# Altium footprint library heromap.PcbLib: 593 footprints (part 33 of 38)
Each footprint in its own frame and in the unit in brackets; x right, y up, seen from the top. Pads: shape width x height; smd on the part's side, far side on the other; paste and mask are expansions set on the pad; w line width, h text height; cw(c..) or ccw(c..) is an arc to the next point about the centre after c.
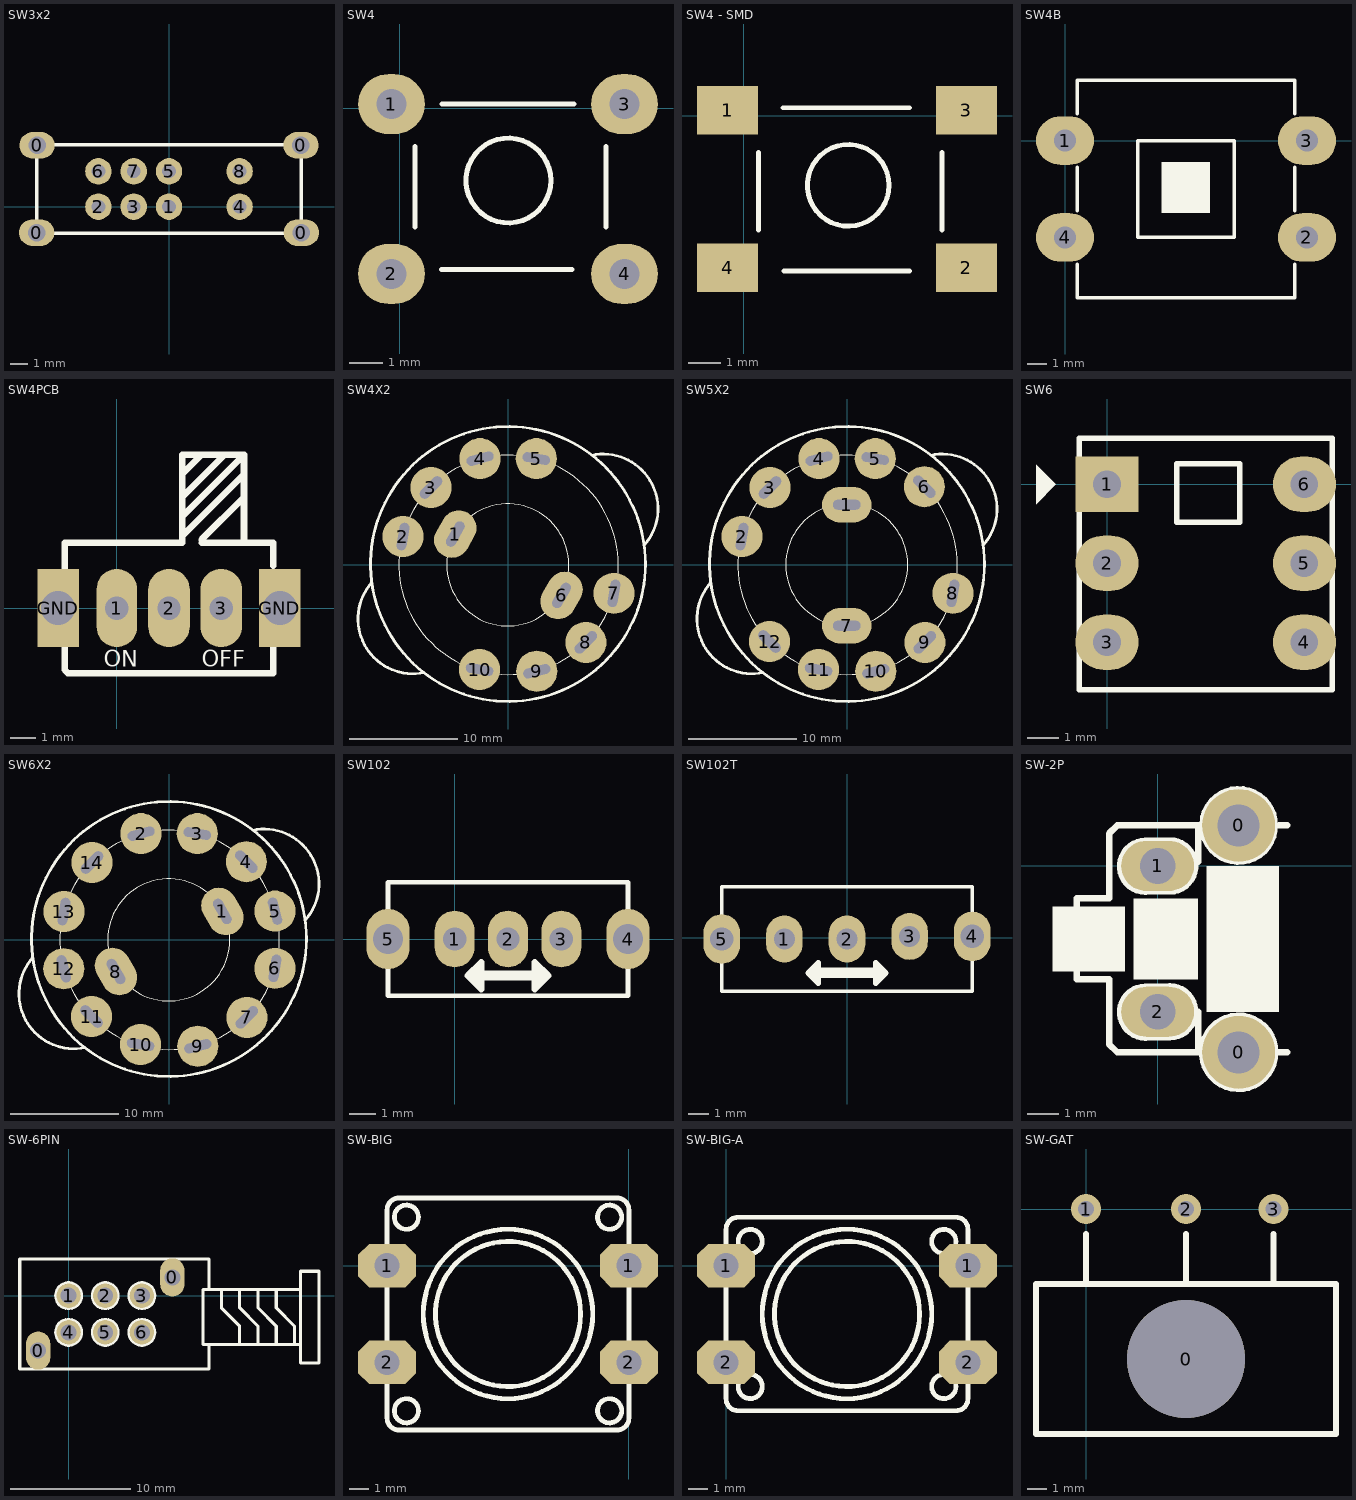
[diagram p32: the footprints below, top view; thin cyan lines are the x and y axes]

## SW3x2 [mil] "Switch 3x2 - pin to pin 80"
height 500
pads (12):
  oval 80x60 hole 40: 0(-300,-59) 0(-299,139) 0(299,139) 0(300,-59)
  round 60 hole 31: 1(0,0) 2(-160,0) 3(-80,0) 4(160,0) 5(0,80) 6(-160,80) 7(-80,80) 8(160,80)
Top Overlay:
  lines w8: -300,-60 300,-60 300,140 -300,140 -300,-60

## SW4 [mm] "SW button 4pin, 250 x250 mil"
height 2.54
pads (4):
  oval 2x1.8 hole 0.9: 1(-0.254,0.127) 2(-0.254,-4.953) 3(6.731,0.127) 4(6.731,-4.953)
Top Overlay:
  circle w0.152: c3.251,-2.159 r1.27
  lines w0.152: 0.457,-3.556 0.457,-1.143 ; 1.245,-4.826 5.156,-4.826 ; 1.27,0.127 5.207,0.127 ; 6.172,-3.556 6.172,-1.143
  lines w0.178: 6.147,-5.207 6.172,-5.182
3D body "SW3dPS-.STEP": height 7, standoff -3.5, extent -0.826,-5.334 7.074,0.866

## SW4 - SMD [mm] "SW button 4pin, 250 x250 mil"
height 2.54
pads (4):
  rect 1.905x1.5 smd: 1(-0.5,0.178) 2(6.926,-4.724) 3(6.926,0.178) 4(-0.5,-4.724)
Top Overlay:
  circle w0.152: c3.251,-2.159 r1.27
  lines w0.152: 0.457,-3.556 0.457,-1.143 ; 1.219,0.254 5.156,0.254 ; 1.245,-4.826 5.156,-4.826 ; 6.172,-3.556 6.172,-1.143
  lines w0.178: 6.147,-5.207 6.172,-5.182
3D body "SW3dPS-.STEP": height 7, standoff -3.5, extent -0.826,-5.334 7.074,0.866

## SW4B [mil] "SW button 4pin, 450 x 450 mil"
height 100
pads (4):
  oval 120x100 hole 45: 1(0,0) 2(500,-200) 3(500,0) 4(0,-200)
Top Overlay:
  rectangle: 199,-150 300,-44
  lines w7: 25,-255 25,-325 475,-325 475,-255 ; 25,-145 25,-55 ; 25,55 25,125 475,125 475,55 ; 475,-145 475,-55 ; 150,-200 150,0 350,0 350,-200 150,-200
3D body "User Library-SWT9-1.STEP": height 288, standoff -137.19, extent 2.09,-337 513.91,135.44

## SW4PCB [mil]
pads (5):
  oval 62x120 hole 36: 1(0,0)
  oval 64x120 hole 36: 2(80,0) 3(160,0)
  rect 64x120 hole 52: GND(-90,0) GND(250,0)
Top Overlay:
  lines w10: -80,-60 -80,-95 -75,-100 240,-100 240,-60 ; -80,60 -80,100 100,100 100,195 ; 100,110 195,205 ; 100,140 190,230 195,230 ; 100,160 100,170 165,235 170,235 ; 130,100 195,100 ; 130,105 195,170 ; 130,235 100,205 100,195 ; 240,65 240,100 195,100 ; 100,195 100,235 195,235 195,195 195,100
  text "ON" at -20,-90 h25
  text "OFF" at 130,-90 h25

## SW4X2 [mil] "Switch 4x2"
height 500
pads (10):
  oval 180x130 hole 35 slot 100 at 60 deg rot 60: 1(-193.57,112.51) 6(193.7,-111.07)
  round 150 hole 35 slot 100 at 80 deg: 2(-384.48,103.48) 7(384.48,-103.48)
  round 150 hole 35 slot 100 at 45 deg: 3(-282.26,282.26) 8(282.26,-282.26)
  round 150 hole 35 slot 100 at 15 deg: 4(-103.48,387.48) 9(103.48,-387.48)
  round 150 hole 35 slot 100 at 170 deg: 5(101.54,387.46) 10(-105.2,-381.27)
Top Overlay:
  circle w1: c-2.46,0.46 r222.5
  circle w1: c0.54,0.46 r400
  circle w10: c-1.46,3.46 r501
  lines w10: -498,-63.94 ccw(c-348.29,-196.56) -307.65,-392.38 ; 303.52,399.93 cw(c345.18,204.32) 495.11,71.95

## SW5X2 [mil] "Switch 5x2"
height 500
pads (12):
  oval 180x130 hole 35 slot 100 at 0 deg: 1(-2.46,219.46) 7(-2.46,-221.54)
  round 150 hole 35 slot 100 at 80 deg: 2(-384.48,103.48) 8(384.48,-103.48)
  round 150 hole 35 slot 100 at 45 deg: 3(-282.26,282.26) 9(282.26,-282.26)
  round 150 hole 35 slot 100 at 15 deg: 4(-103.48,387.48) 10(103.48,-387.48)
  round 150 hole 35 slot 100 at 170 deg: 5(101.54,387.46) 11(-105.2,-381.27)
  round 150 hole 35 slot 100 at 135 deg: 6(280.32,285.24) 12(-283.98,-279.05)
Top Overlay:
  circle w10: c-1.46,3.46 r501
  circle w1: c0.54,0.46 r400
  circle w1: c-2.46,0.46 r222.5
  lines w10: -498,-63.94 ccw(c-348.29,-196.56) -307.65,-392.38 ; 303.52,399.93 cw(c345.18,204.32) 495.11,71.95

## SW6 [mil] "SW DTDP - 6Pin 260x300x300 mil"
pads (6):
  rect 80x70 hole 35: 1(0,0)
  oval 80x70 hole 35: 2(0,-100) 3(0,-200) 4(250,-200) 5(250,-100) 6(250,0)
Top Overlay:
  region: -90,25 -65,0 -90,-25
  lines w7: 165,26 88,26 88,-48 168,-48 168,26 ; -35,-260 -35,58 285,58 285,-260 -35,-260

## SW6X2 [mil] "Switch 6x2"
height 500
pads (14):
  oval 180x130 hole 35 slot 100 at 120 deg rot 120: 1(193,104) 8(-195,-115)
  round 150 hole 35 slot 100 at 15 deg: 2(-103.48,387.48) 9(103.48,-387.48)
  round 150 hole 35 slot 100 at 170 deg: 3(101.54,387.46) 10(-105.2,-381.27)
  round 150 hole 35 slot 100 at 135 deg: 4(280.32,285.24) 11(-283.98,-279.05)
  round 150 hole 35 slot 100 at 105 deg: 5(385,105) 12(-385,-105)
  round 150 hole 35 slot 100 at 80 deg: 6(384.48,-103.48) 13(-384.48,103.48)
  round 150 hole 35 slot 100 at 45 deg: 7(282.26,-282.26) 14(-282.26,282.26)
Top Overlay:
  circle w1: c-2.46,0.46 r222.5
  circle w1: c0.54,0.46 r400
  circle w10: c-1.46,3.46 r501
  lines w10: -498,-63.94 ccw(c-348.29,-196.56) -307.65,-392.38 ; 303.52,399.93 cw(c345.18,204.32) 495.11,71.95

## SW102 [mil] "Switch 102 On Board nho"
height 2
pads (5):
  oval 60x85 hole 35: 1(0,0) 2(80,0) 3(160,0)
  oval 65x90 hole 45: 4(260,0) 5(-100,0)
Top Overlay:
  lines w7: -100,-45 -100,-85 260,-85 260,-45 ; -100,45 -100,85 260,85 260,45
  lines w10: 20,-55 40,-75 40,-35 20,-55 ; 120,-75 140,-55 120,-35 120,-75
  lines w15: 30,-55 130,-55

## SW102T [mil] "Switch 102 On Board To"
height 2
pads (5):
  oval 70x90 hole 40: 1(-120,-2.5) 2(0,-2.5) 3(120,2.5)
  oval 70x95 hole 45: 4(240,2.5) 5(-240,-2.5)
Top Overlay:
  lines w7: -240,-50 -240,-102.5 240,-102.5 240,-45 ; -240,45 -240,97.5 240,97.5 240,45
  lines w10: -75,-67.5 -55,-87.5 -55,-47.5 -75,-67.5 ; 55,-87.5 75,-67.5 55,-47.5 55,-87.5
  lines w20: -65,-67.5 65,-67.5

## SW-2P [mil]
pads (4):
  round 90 hole 52: 0(100,-230) 0(100,50)
  oval 90x62 hole 44: 1(0,0) 2(0,-180)
Top Overlay:
  circle w8: c100,50 r44.72
  circle w8: c100,-230 r45.28
  region: -130,-50 -130,-130 -40,-130 -40,-50
  region: -30,-40 -30,-140 50,-140 50,-40
  region: 60,0 60,-180 150,-180 150,0
  lines w8: 50,-180 50,-230 40,-230 -50,-230 -60,-220 -60,-140 -100,-140 -100,-40 -60,-40 -60,40 -50,50 40,50 50,50 50,5 ; 150,-230 160,-230 ; 150,50 160,50
  lines w10: -15,-210.83 cw(c-15,-180.41) -15,-150 14.59,-150 ; -15,-30.83 cw(c-15,-0.41) -15,30 14.59,30 ; -14.59,-210.41 15,-210.41 ccw(c15,-180) 15,-149.59 ; -14.59,-30.41 15,-30.41 ccw(c15,0) 15,30.41

## SW-6PIN [mil]
pads (8):
  oval 80x125 hole 52: 0(-100,-180) 0(340,60)
  round 80 hole 52: 1(0,0) 2(120,0) 3(240,0) 4(0,-120) 5(120,-120) 6(240,-120)
Top Overlay:
  circle w10: c0,-120 r42.43
  circle w10: c120,-120 r42.43
  circle w10: c240,-120 r42.43
  circle w10: c240,0 r42.43
  circle w10: c120,0 r42.43
  circle w10: c0,0 r42.43
  lines w10: 500,20 500,-40 560,-100 560,-160 ; 560,20 560,-40 620,-100 620,-160 ; 620,20 620,-40 680,-100 680,-160 ; 680,20 680,-40 740,-100 740,-160 ; 460,-160 440,-160 440,20 460,20 ; 460,-160 460,-240 -160,-240 -160,100 -160,120 460,120 460,20 ; 460,-160 760,-160 ; 460,20 760,20 ; 760,-160 760,-220 820,-220 820,80 760,80 760,20 ; 760,-160 760,20

## SW-BIG [mil]
pads (4):
  oct 120x90 hole 52: 1(-500,0) 1(0,0) 2(-500,-200) 2(0,-200)
Top Overlay:
  circle w10: c-460,100 r25
  circle w10: c-40,100 r25
  circle w10: c-40,-300 r25
  circle w10: c-460,-300 r25
  circle w10: c-250,-100 r175
  circle w10: c-250,-100 r150
  lines w10: -500,-250 -500,-275 ; -450,-340 -475,-340 ; -450,140 -475,140 ; -50,-340 -25,-340 ; -50,140 -25,140 ; 0,-250 0,-275 ; -500,-275 -500,75 -500,90 -500,115 cw(c-475,115) -475,140 ; -500,-275 -500,-315 ccw(c-475,-315) -475,-340 ; -475,-340 -25,-340 ; -475,140 -25,140 ; -25,-340 ccw(c-25,-315) 0,-315 0,-275 ; -25,140 cw(c-25,115) 0,115 0,90 0,75 0,-275
3D body "User Library-SWT9-1.STEP": height 288, standoff -137.19, extent -506.91,-338 4.91,134.44

## SW-BIG-A [mil]
pads (4):
  oct 120x90 hole 52: 1(0,0) 1(500,0) 2(0,-200) 2(500,-200)
Top Overlay:
  circle w10: c50,50 r25
  circle w10: c450,50 r25
  circle w10: c450,-250 r25
  circle w10: c50,-250 r25
  circle w10: c250,-100 r175
  circle w10: c250,-100 r150
  lines w10: 0,-250 0,-275 ; 0,50 0,75 ; 50,-300 25,-300 ; 50,100 25,100 ; 450,-300 475,-300 ; 450,100 475,100 ; 500,-250 500,-275 ; 500,50 500,75 ; 0,-275 ccw(c25,-275) 25,-300 ; 0,-275 0,75 ; 0,75 cw(c25,75) 25,100 ; 25,-300 475,-300 ; 25,100 475,100 ; 475,-300 ccw(c475,-275) 500,-275 ; 475,100 cw(c475,75) 500,75 ; 500,-275 500,75

## SW-GAT [mm]
pads (4):
  round 6 hole 6: 0(5.08,-7.62)
  round 1.524 hole 0.8: 1(0,0) 2(5.08,0) 3(9.525,0)
Top Overlay:
  lines w0.305: 0,-3.81 0,-1.27 ; 5.08,-3.81 5.08,-1.27 ; 9.525,-3.81 9.525,-1.27 ; -2.54,-11.43 -2.54,-3.81 12.7,-3.81 12.7,-11.43 -2.54,-11.43